# Altium integrated library ATK-DLMP135_baseboard_packaging_libraryV1.0.IntLib: 70 symbols
Pins are listed as number, name and electrical type; pins without a type are passive.

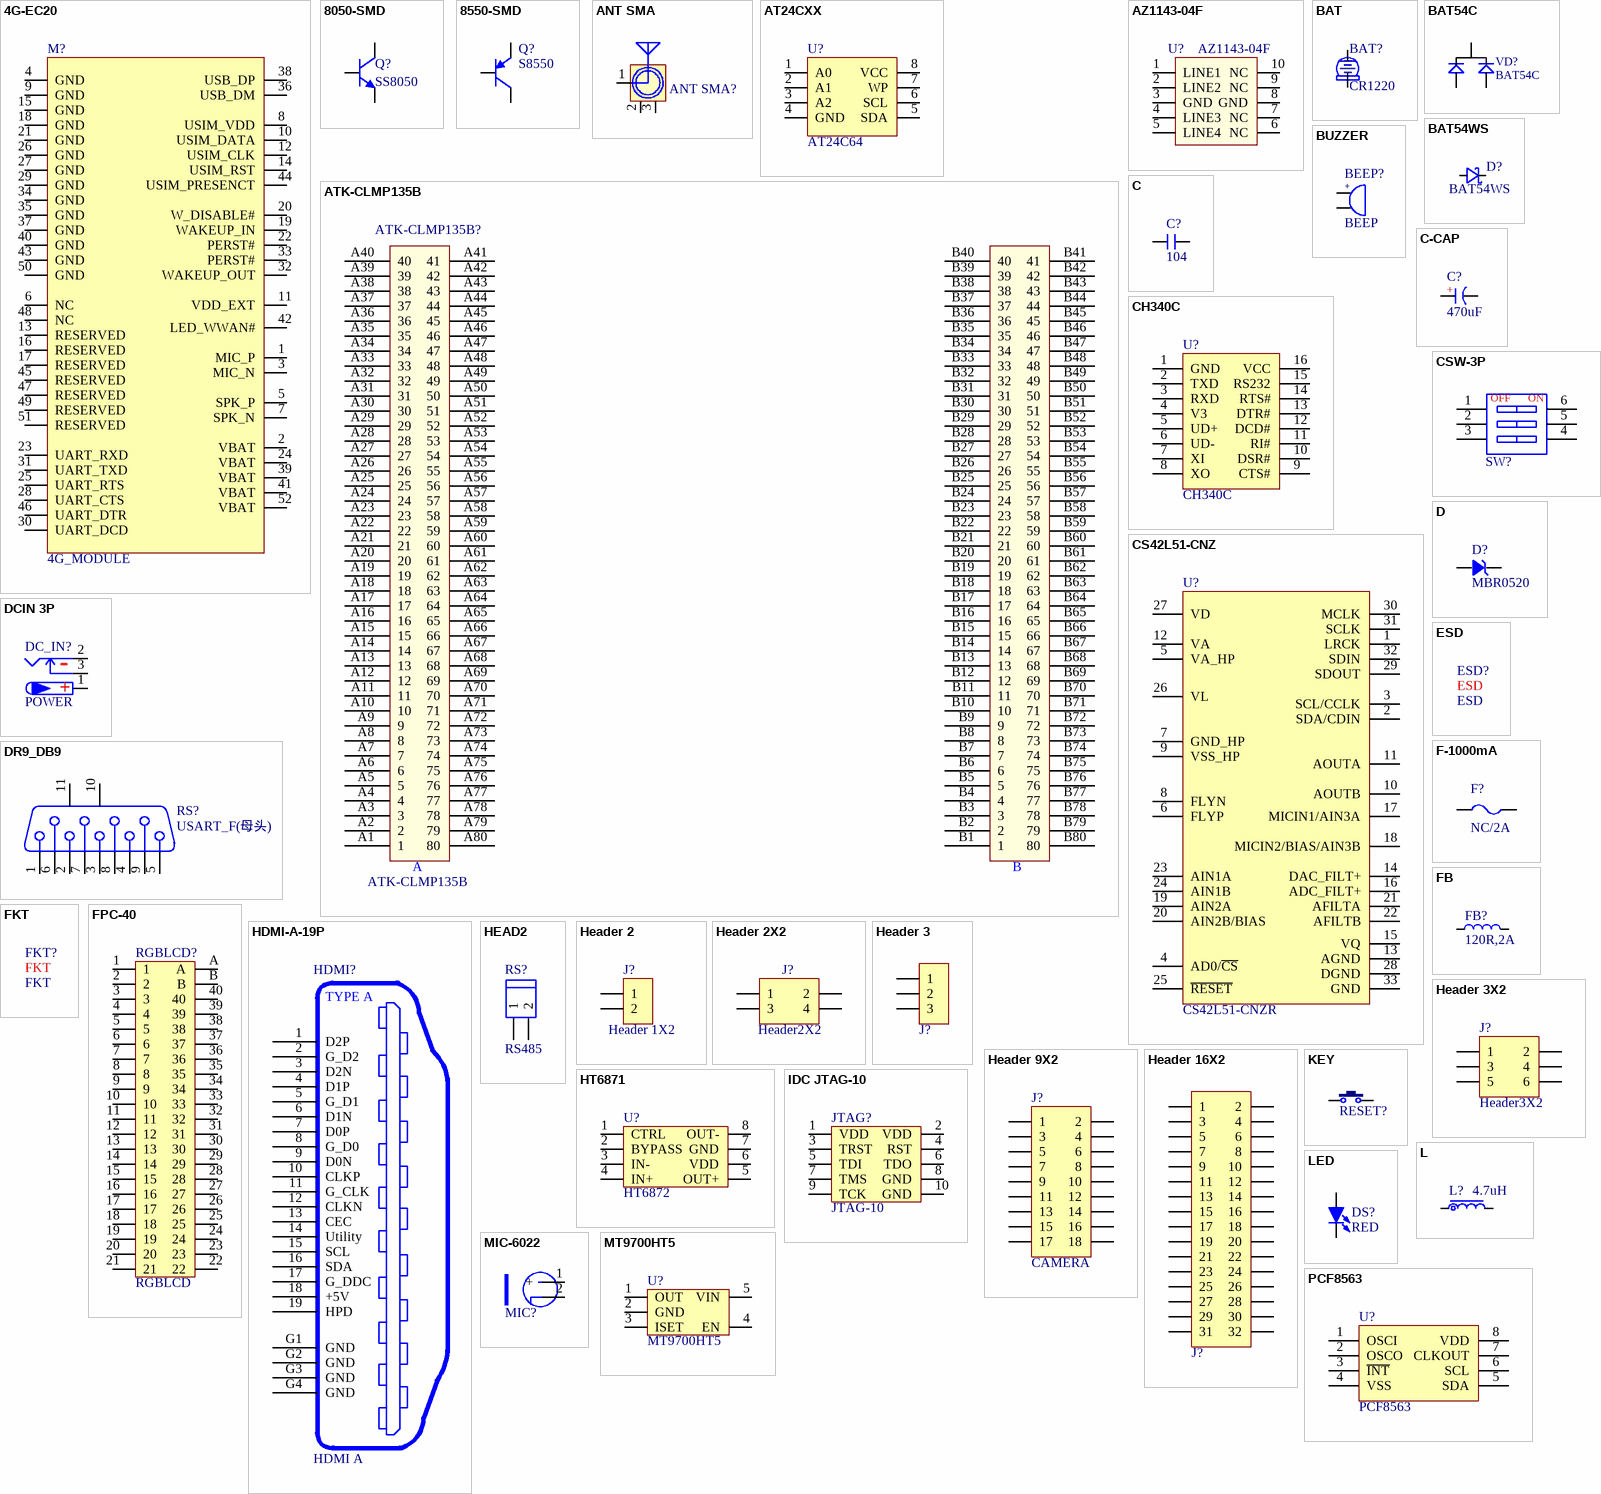
[diagram p0: symbols 4G-EC20 to PCF8563]

## 4G-EC20
designator M?, comment 4G_MODULE
Mini PCIE座子52P; 版权归属: 正点原子; Parameter: 接口器件; 学习资源: www.openedv.com
footprint Mini PCIE 52P
pins: 1 MIC_P, 2 VBAT, 3 MIC_N, 4 GND, 5 SPK_P, 6 NC, 7 SPK_N, 8 USIM_VDD, 9 GND, 10 USIM_DATA, 11 VDD_EXT, 12 USIM_CLK, 13 RESERVED, 14 USIM_RST, 15 GND, 16 RESERVED, 17 RESERVED, 18 GND, 19 WAKEUP_IN, 20 W_DISABLE#, 21 GND, 22 PERST#, 23 UART_RXD, 24 VBAT, 25 UART_RTS, 26 GND, 27 GND, 28 UART_CTS, 29 GND, 30 UART_DCD, 31 UART_TXD, 32 WAKEUP_OUT, 33 PERST#, 34 GND, 35 GND, 36 USB_DM, 37 GND, 38 USB_DP, 39 VBAT, 40 GND, 41 VBAT, 42 LED_WWAN#, 43 GND, 44 USIM_PRESENCT, 45 RESERVED, 46 UART_DTR, 47 RESERVED, 48 NC, 49 RESERVED, 50 GND, 51 RESERVED, 52 VBAT

## 8050-SMD
designator Q?, comment SS8050
高频放大-NPN型; 版权归属: 正点原子; 属性: 40V 1.5A 1W 100MHZ; Parameter: 三极管; BOM名称: 高频放大-NPN型; 学习资源: www.openedv.com
footprint SOT23-3N (3x1.3x1mm(长宽高))
footprint SOT23-3L (3x1.3x1mm(长宽高))
pins: 1 B, 2 E, 3 C

## 8550-SMD
designator Q?, comment S8550
高频放大-PNP型; 版权归属: 正点原子; 属性: 40V 1.5A 1W 100MHZ; Parameter: 三极管; BOM名称: 高频放大-PNP型; 学习资源: www.openedv.com
footprint SOT23-3N (3x1.3x1mm(长宽高))
footprint SOT23-3L (3x1.3x1mm(长宽高))
pins: 1 B, 2 E, 3 C

## ANT SMA
designator ANT SMA?  (value not drawn)
SMA-2.4G射频天线接口
footprint SMA_FR (SMA 90度射频天线座)
pins: 1 ANT, 2 GND, 3 GND

## AT24CXX
designator U?, comment AT24C64
外置EEPROM; 版权归属: 正点原子; Parameter: 芯片; BOM名称: 外置EEPROM; 学习资源: www.openedv.com
footprint SOP8_N (5*6*1.8mm（长宽高）)
pins: 1 A0, 2 A1, 3 A2, 4 GND, 5 SDA, 6 SCL, 7 WP, 8 VCC (power)

## ATK-CLMP135B
designator ATK-CLMP135B?
MP135核心板BTB连接座
footprint ATK-CLMP135B_CORE
pins: A1 1, A2 2, A3 3, A4 4, A5 5, A6 6, A7 7, A8 8, A9 9, A10 10, A11 11, A12 12, A13 13, A14 14, A15 15, A16 16, A17 17, A18 18, A19 19, A20 20, A21 21, A22 22, A23 23, A24 24, A25 25, A26 26, A27 27, A28 28, A29 29, A30 30, A31 31, A32 32, A33 33, A34 34, A35 35, A36 36, A37 37, A38 38, A39 39, A40 40, A41 41, A42 42, A43 43, A44 44, A45 45, A46 46, A47 47, A48 48, A49 49, A50 50, A51 51, A52 52, A53 53, A54 54, A55 55, A56 56, A57 57, A58 58, A59 59, A60 60, A61 61, A62 62, A63 63, A64 64, A65 65, A66 66, A67 67, A68 68, A69 69, A70 70, A71 71, A72 72, A73 73, A74 74, A75 75, A76 76, A77 77, A78 78, A79 79, A80 80, B1 1, B2 2, B3 3, B4 4, B5 5, B6 6, B7 7, B8 8, B9 9, B10 10, B11 11, B12 12, B13 13, B14 14, B15 15, B16 16, B17 17, B18 18, B19 19, B20 20, B21 21, B22 22, B23 23, B24 24, B25 25, B26 26, B27 27, B28 28, B29 29, B30 30, B31 31, B32 32, B33 33, B34 34, B35 35, B36 36, B37 37, B38 38, B39 39, B40 40, B41 41, B42 42, B43 43, B44 44, B45 45, B46 46, B47 47, B48 48, B49 49, B50 50, B51 51, B52 52, B53 53, B54 54, B55 55, B56 56, B57 57, B58 58, B59 59, B60 60, B61 61, B62 62, B63 63, B64 64, B65 65, B66 66, B67 67, B68 68, B69 69, B70 70, B71 71, B72 72, B73 73, B74 74, B75 75, B76 76, B77 77, B78 78, B79 79, B80 80
text: A; B

## AZ1143-04F
designator U?
ESD保护二极管阵列
footprint DFN2510P10E
pins: 1 LINE1, 2 LINE2, 3 GND, 4 LINE3, 5 LINE4, 6 NC, 7 NC, 8 GND, 9 NC, 10 NC

## BAT
designator BAT?, comment CR1220
电池座; BOM名称: 微型电池; 版权归属: 正点原子; Parameter: 电池; 学习资源: www.openedv.com
footprint CR1220 (纽扣电池座)
pins: 1 DC+, 2 DC-

## BAT54C
designator VD?
肖特基二极管（双）
footprint SOT23-3L (3x1.3x1mm(长宽高))
pins: 1, 2, 3

## BAT54WS
designator D?
肖特基二极管 30V  1V@100mA; 版权归属: 正点原子; 学习资源: www.openedv.com; Parameter: 肖特基二极管
footprint SOD-323
pins: 1 A, 2 K

## BUZZER
designator BEEP?, comment BEEP
蜂鸣器; 版权归属: 正点原子; BOM名称: 蜂鸣器; 学习资源: www.openedv.com; Parameter: 蜂鸣器
footprint BEEP 5.08X9X5.5 (蜂鸣器 5.08*9*5.5mm(脚距,直径))
pins: 1, 2
text: +

## C
designator C?, comment 104
无极性电容; BOM名称: 无极性贴片电容; 版权归属: 正点原子; 学习资源: www.openedv.com
footprint C 0603 (无极性贴片电容)
pins: 1, 2

## C-CAP
designator C?, comment 470uF
有极性电容; 版权归属: 正点原子; 学习资源: www.openedv.com; BOM名称: 有极性电容
footprint CD 6.3*7.7 S (有极性贴片电容直径6.3mm高度7.7mm))
pins: 1 A, 2 K
text: +

## CH340C
designator U?
USB转串口; BOM名称: 串口转USB; 版权归属: 正点原子; Parameter: 芯片; 学习资源: www.openedv.com
footprint SOP16_N (10.3*6.2*1.8mm（长宽高）)
pins: 1 GND, 2 TXD, 3 RXD, 4 V3, 5 UD+, 6 UD-, 7 XI, 8 XO, 9 CTS#, 10 DSR#, 11 RI#, 12 DCD#, 13 DTR#, 14 RTS#, 15 RS232, 16 VCC

## CS42L51-CNZ
designator U?, comment CS42L51-CNZR
音频编解码芯片; 版权归属: 正点原子; Parameter: 芯片; 学习资源: www.openedv.com
footprint QFN32 5x5_N (32脚，长：5mm，宽：5mm，高：9.5mm)
pins: 1 LRCK, 2 SDA/CDIN, 3 SCL/CCLK, 4 AD0/~{CS}, 5 VA_HP (power), 6 FLYP, 7 GND_HP (power), 8 FLYN, 9 VSS_HP (power), 10 AOUTB, 11 AOUTA, 12 VA (power), 13 AGND (power), 14 DAC_FILT+ (power), 15 VQ (power), 16 ADC_FILT+ (power), 17 MICIN1/AIN3A, 18 MICIN2/BIAS/AIN3B, 19 AIN2A, 20 AIN2B/BIAS, 21 AFILTA, 22 AFILTB, 23 AIN1A, 24 AIN1B, 25 ~{RESET}, 26 VL (power), 27 VD (power), 28 DGND (power), 29 SDOUT, 30 MCLK, 31 SCLK, 32 SDIN, 33 GND (power)

## CSW-3P
designator SW?  (value not drawn)
3路编码开关; 版权归属: 正点原子; Parameter: 按键/开关; BOM名称: 3路编码开关; 学习资源: www.openedv.com
footprint CSW 2.54 DIP-3P (拨码开关 2.54mm 3码6脚 直插)
pins: 1, 2, 3, 4, 5, 6
text: OFF; ON

## D
designator D?, comment MBR0520
稳压二极管
footprint SOD-123 (二极管)
footprint SOD-323 (二极管)
footprint SMA
pins: 1, 2

## DCIN 3P
designator DC_IN?, comment POWER
三脚电源座; BOM名称: DC电源接口; 版权归属: 正点原子; Parameter: 接口器件; 学习资源: www.openedv.com
footprint DC10B
pins: 1 (power), 2 (power), 3 (power)
text: -; +

## DR9_DB9
designator RS?, comment USART_F(母头)
9针串口; 版权归属: 正点原子; Parameter: 接口器件; BOM名称: 9针串口; 学习资源: www.openedv.com
footprint DB9(DR9)/S_A(母头) (9针母头串口,31*18.5*12.5mm)
pins: 1, 2, 3, 4, 5, 6, 7, 8, 9, 10 MH1, 11 MH2

## ESD
designator ESD?
防静电; BOM名称: 散热片; 版权归属: 正点原子; Parameter: 未分类器件; 学习资源: www.openedv.com
footprint ESD

## F-1000mA
designator F?, comment NC/2A
自恢复保险丝
footprint FU 1206 (贴片保险丝(1206))
pins: 1, 2

## FB
designator FB?, comment 120R,2A
贴片磁珠; BOM名称: 小功率贴片电感; 版权归属: 正点原子; Parameter: 电感/磁珠; 学习资源: www.openedv.com
footprint L 0603 (小功率贴片电感)
pins: 1, 2

## FKT
designator FKT?
可回收; BOM名称: 散热片; 版权归属: 正点原子; Parameter: 未分类器件; 学习资源: www.openedv.com
footprint FKT

## FPC-40
designator RGBLCD?, comment RGBLCD
FPC-40P-0.5mm
footprint FPC0.5-TOP40P (FPCTOP;0.5mm;)
pins: 1, 2, 3, 4, 5, 6, 7, 8, 9, 10, 11, 12, 13, 14, 15, 16, 17, 18, 19, 20, 21, 22, 23, 24, 25, 26, 27, 28, 29, 30, 31, 32, 33, 34, 35, 36, 37, 38, 39, 40, A, B

## HDMI-A-19P
designator HDMI?, comment HDMI A
HDMI座子; 版权归属: 正点原子; Parameter: 接口器件; 学习资源: www.openedv.com
footprint HDMI-A (A型 直插 HDMI座子)
pins: 1 D2P, 2 G_D2, 3 D2N, 4 D1P, 5 G_D1, 6 D1N, 7 D0P, 8 G_D0, 9 D0N, 10 CLKP, 11 G_CLK, 12 CLKN, 13 CEC, 14 Utility, 15 SCL, 16 SDA, 17 G_DDC, 18 +5V, 19 HPD, G1 GND, G2 GND, G3 GND, G4 GND
text: TYPE A

## HEAD2
designator RS?, comment RS485
footprint KF301-2P
pins: 1, 2

## Header 2
designator J?, comment Header 1X2
2P接插件; 版权归属: 正点原子; Parameter: 接插件; BOM名称: 2P接插件; 学习资源: www.openedv.com
footprint Header 2.54 1X2P (排针(1X2P,2.54,直插))
pins: 1, 2

## Header 2X2
designator J?, comment Header2X2
2*2P接插件; 版权归属: 正点原子; Parameter: 接插件; BOM名称: 2*2P接插件; 学习资源: www.openedv.com
footprint Header 2.54 2X2P (排针(2X2P,2.54,直插))
pins: 1, 2, 3, 4

## Header 3
designator J?, comment Header 1X3  (value not drawn)
3P接插件; 版权归属: 正点原子; Parameter: 接插件; BOM名称: 3P接插件; 学习资源: www.openedv.com
footprint Header 2.54 1X3P (排针(1X3P,2.54,直插))
pins: 1, 2, 3

## Header 3X2
designator J?, comment Header3X2
3*2P接插件; 版权归属: 正点原子; Parameter: 接插件; BOM名称: 3*2P接插件; 学习资源: www.openedv.com
footprint Header 2.54 2X3P (排针(2X3P,2.54,直插))
pins: 1, 2, 3, 4, 5, 6

## Header 9X2
designator J?, comment CAMERA
9*2P接插件; 版权归属: 正点原子; Parameter: 接插件; BOM名称: 9*2P接插件; 学习资源: www.openedv.com
footprint Socket 2.54 2X9P
pins: 1, 2, 3, 4, 5, 6, 7, 8, 9, 10, 11, 12, 13, 14, 15, 16, 17, 18

## Header 16X2
designator J?, comment Header 2X16  (value not drawn)
16*2P接插件; 版权归属: 正点原子; Parameter: 接插件; BOM名称: 16*2P接插件; 学习资源: www.openedv.com
footprint Header 2.54 2X16P (排针(2X16P,2.54,直插))
pins: 1, 2, 3, 4, 5, 6, 7, 8, 9, 10, 11, 12, 13, 14, 15, 16, 17, 18, 19, 20, 21, 22, 23, 24, 25, 26, 27, 28, 29, 30, 31, 32

## HT6871
designator U?, comment HT6872
小喇叭功放芯片; 版权归属: 正点原子; Parameter: 芯片; 学习资源: www.openedv.com
footprint SOP8_N (5*6*1.8mm（长宽高）)
pins: 1 CTRL, 2 BYPASS, 3 IN-, 4 IN+, 5 OUT+, 6 VDD, 7 GND, 8 OUT-

## IDC JTAG-10
designator JTAG?, comment JTAG-10
10Pin JTAG 2.0间距; 版权归属: 正点原子; Parameter: 接口器件; 学习资源: www.openedv.com
footprint JTAG-10 2.0 (JTAG-10 2.0间距)
pins: 1 VDD, 2 VDD, 3 TRST, 4 RST, 5 TDI, 6 TDO, 7 TMS, 8 GND, 9 TCK, 10 GND

## KEY
designator RESET?  (value not drawn)
按键; BOM名称: 3x6轻触开关; 版权归属: 源创客; 学习资源: www.ooocke.com
footprint TSW DIP-6*6*8-2 (6*6*8mm)
pins: 1, 2

## L
designator L?, comment 4.7uH
电感; BOM名称: 功率屏蔽电感; 版权归属: 正点原子; Parameter: 电感/磁珠; 学习资源: www.openedv.com
footprint L-0420 (贴片电感-0420)
footprint L-2520 (贴片电感-2520)
pins: 1, 2

## LED
designator DS?, comment RED
LED; BOM名称: 插件LED; 版权归属: 正点原子; Parameter: 发光二极管; 学习资源: www.openedv.com
footprint LED 0805 Green (绿色0805LED)
footprint LED 0805 Red (红色0805LED)
footprint LED 0805 Yellow (黄色0805LED)
footprint LED 0805 Blue (蓝色0805LED)
pins: 1 A, 2 K

## MIC-6022
designator MIC?  (value not drawn)
MIC; 版权归属: 正点原子; Parameter: 接口器件; 学习资源: www.openedv.com
footprint MIC-6022 (咪头)
pins: 1 +, 2 GND

## MT9700HT5
designator U?
功率开关(5.5V-2A); BOM名称: 稳压芯片; 版权归属: 正点原子; Parameter: 芯片; 学习资源: www.openedv.com
footprint SOT23-5N (3x1.6x1.1mm(长宽高))
pins: 1 OUT, 2 GND, 3 ISET, 4 EN, 5 VIN

## PCF8563
designator U?
footprint SOP8_N (5*6*1.8mm（长宽高）)
pins: 1 OSCI, 2 OSCO, 3 ~{INT}, 4 VSS, 5 SDA, 6 SCL, 7 CLKOUT, 8 VDD

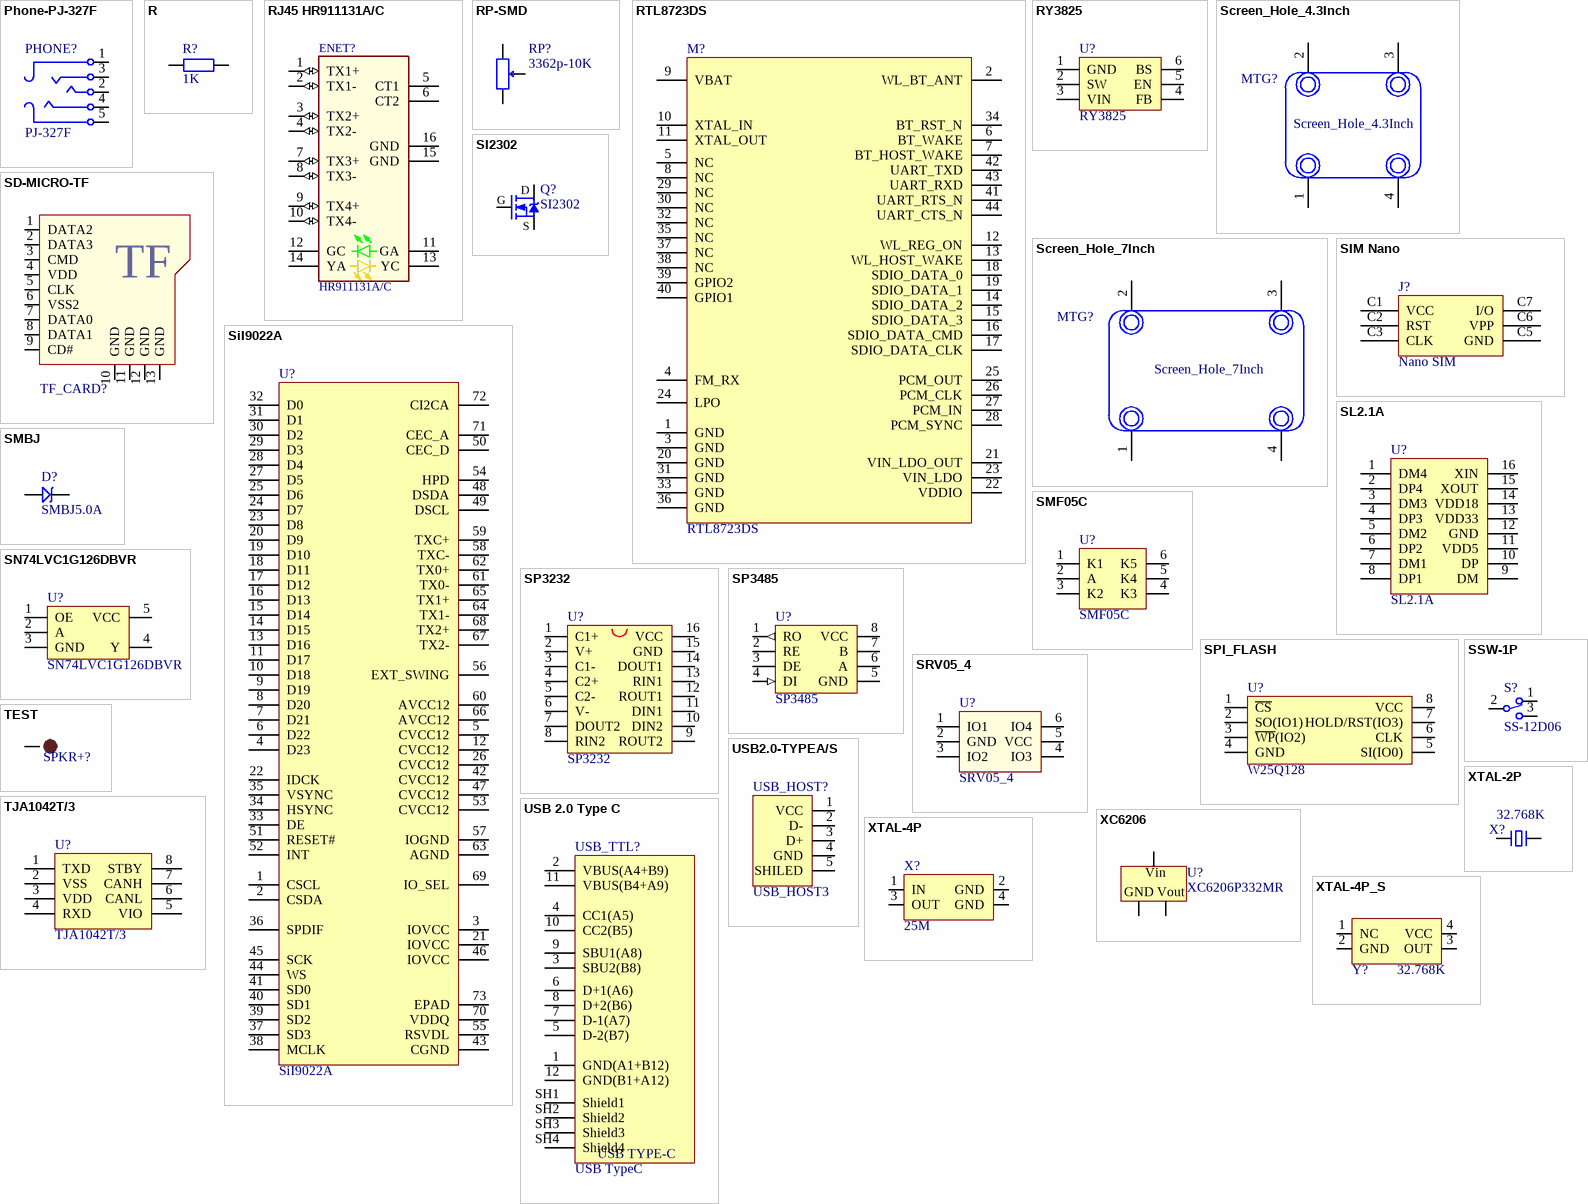
[diagram p1: symbols Phone-PJ-327F to XTAL-4P_S]

## Phone-PJ-327F
designator PHONE?, comment PJ-327F
3.5mm耳机座，带麦; 版权归属: 正点原子; Parameter: 接口器件; 学习资源: www.openedv.com
footprint PJ327F (3.5音频接口，带麦)
pins: 1, 2, 3, 4, 5

## R
designator R?, comment 1K
电阻; BOM名称: 贴片电阻; 版权归属: 正点原子; 学习资源: www.openedv.com; Parameter: 电阻
footprint R 0603 (1/10W贴片电阻)
pins: 1, 2

## RJ45 HR911131A/C
designator ENET?, comment HR911131A/C
千兆以太网接口; 版权归属: 正点原子; Parameter: 接口器件; 学习资源: www.openedv.com
footprint HR911131A (千兆网络RJ45座子)
pins: 1 TX1+ (io), 2 TX1- (io), 3 TX2+ (io), 4 TX2- (io), 5 CT1, 6 CT2, 7 TX3+ (io), 8 TX3- (io), 9 TX4+ (io), 10 TX4- (io), 11 GA, 12 GC, 13 YC, 14 YA, 15 GND (power), 16 GND (power)

## RP-SMD
designator RP?, comment 3362p-10K
电位器; BOM名称: 贴片电位器; 版权归属: 正点原子; Parameter: 电阻; 学习资源: www.openedv.com
footprint 3362P (电位器 100K)
pins: 1, 2, 3

## RTL8723DS
designator M?
SDIO WIFI&BT
footprint WIFI&BT-Module-44P (WIFI&BT模块)
pins: 1 GND, 2 WL_BT_ANT, 3 GND, 4 FM_RX, 5 NC, 6 BT_WAKE, 7 BT_HOST_WAKE, 8 NC, 9 VBAT, 10 XTAL_IN, 11 XTAL_OUT, 12 WL_REG_ON, 13 WL_HOST_WAKE, 14 SDIO_DATA_2, 15  SDIO_DATA_3, 16  SDIO_DATA_CMD, 17 SDIO_DATA_CLK, 18 SDIO_DATA_0, 19 SDIO_DATA_1, 20 GND, 21 VIN_LDO_OUT, 22 VDDIO, 23 VIN_LDO, 24 LPO, 25 PCM_OUT, 26 PCM_CLK, 27 PCM_IN, 28 PCM_SYNC, 29 NC, 30 NC, 31 GND, 32 NC, 33 GND, 34  BT_RST_N, 35 NC, 36 GND, 37 NC, 38 NC, 39 GPIO2, 40 GPIO1, 41 UART_RTS_N, 42 UART_TXD, 43 UART_RXD, 44 UART_CTS_N

## RY3825
designator U?
DC同步降压 4-18V 2A 600KHz Vr=0.768V; 版权归属: 正点原子; Parameter: 芯片; 学习资源: www.openedv.com
footprint SOT23-6N
pins: 1 GND, 2 SW, 3 VIN, 4 FB, 5 EN, 6 BS

## Screen_Hole_4.3Inch
designator MTG?
4.3寸显示屏螺丝孔
footprint 4.3inch_RGBLCD_Hole (4.3寸显示屏螺丝孔)
pins: 1, 2, 3, 4

## Screen_Hole_7Inch
designator MTG?
7寸显示屏螺丝孔
footprint 7Inch_RGBLCD_HOLE (7寸显示屏螺丝孔)
pins: 1, 2, 3, 4

## SD-MICRO-TF
designator TF_CARD?  (value not drawn)
SD,MICRO,TF
footprint SD-MICRO-TF (TF卡座)
pins: 1 DATA2, 2 DATA3, 3 CMD, 4 VDD, 5 CLK, 6 VSS2, 7 DATA0, 8 DATA1, 9 CD#, 10 GND, 11 GND, 12 GND, 13 GND
text: TF

## SI2302
designator Q?
NMOS 20V-+3.0A 55mΩ; BOM名称: N沟道场效应管; 版权归属: 正点原子; Parameter: MOS管; 学习资源: www.openedv.com
footprint SOT23-3N (3x1.3x1mm(长宽高))
pins: 1 G, 2 S, 3 D

## SiI9022A
designator U?
RGB转HDMI芯片; 版权归属: 正点原子; Parameter: 芯片; 学习资源: www.openedv.com
footprint QFN72 10X10 (QFN72P 长10mm，宽10mm)
pins: 1 CSCL, 2 CSDA, 3 IOVCC, 4 D23, 5 CVCC12, 6 D22, 7 D21, 8 D20, 9 D19, 10 D18, 11 D17, 12 CVCC12, 13 D16, 14 D15, 15 D14, 16 D13, 17 D12, 18 D11, 19 D10, 20 D9, 21 IOVCC, 22 IDCK, 23 D8, 24 D7, 25 D6, 26 CVCC12, 27 D5, 28 D4, 29 D3, 30 D2, 31 D1, 32 D0, 33 DE, 34 HSYNC, 35 VSYNC, 36 SPDIF, 37 SD3, 38 MCLK, 39 SD2, 40 SD1, 41 SD0, 42 CVCC12, 43 CGND, 44 WS, 45 SCK, 46 IOVCC, 47 CVCC12, 48 DSDA, 49 DSCL, 50 CEC_D, 51 RESET#, 52 INT, 53 CVCC12, 54 HPD, 55 RSVDL, 56 EXT_SWING, 57 IOGND, 58 TXC-, 59 TXC+, 60 AVCC12, 61 TX0-, 62 TX0+, 63 AGND, 64 TX1-, 65 TX1+, 66 AVCC12, 67 TX2-, 68 TX2+, 69 IO_SEL, 70 VDDQ, 71 CEC_A, 72 CI2CA, 73 EPAD

## SIM Nano
designator J?, comment Nano SIM
Nano SIM卡座; 版权归属: 正点原子; Parameter: 接口器件; 学习资源: www.openedv.com
footprint Nano SIM 7P (7P弹出式Nano SIM卡座)
pins: C1 VCC, C2 RST, C3 CLK, C4 NC hidden, C5 GND, C6 VPP, C7 I/O

## SL2.1A
designator U?
1拖4 USB HUB; BOM名称: 串口转USB; 版权归属: 正点原子; Parameter: 芯片; 学习资源: www.openedv.com
footprint SOP16_N
pins: 1 DM4, 2 DP4, 3 DM3, 4 DP3, 5 DM2, 6 DP2, 7 DM1, 8 DP1, 9 DM, 10 DP, 11 VDD5, 12 GND, 13 VDD33, 14 VDD18, 15 XOUT, 16 XIN

## SMBJ
designator D?, comment SMBJ5.0A
TVS
footprint SMBJ
pins: 1, 2

## SMF05C
designator U?
5线TVS管; 版权归属: 正点原子; Parameter: 芯片; 学习资源: www.openedv.com
footprint SOT363-6L (2.0x2.1x1.1mm(长宽高))
pins: 1 K1, 2 A, 3 K2, 4 K3, 5 K4, 6 K5

## SN74LVC1G126DBVR
designator U?
1路 非反向三态缓冲器 高有效; 版权归属: 正点原子; Parameter: 芯片; 学习资源: www.openedv.com
footprint SOT23-5N
pins: 1 OE, 2 A, 3 GND, 4 Y, 5 VCC

## SP3232
designator U?
RS232通讯芯片; 版权归属: 正点原子; Parameter: 芯片; BOM名称: RS232通讯芯片; 学习资源: www.openedv.com
footprint SOP16_N (10.3*6.2*1.8mm（长宽高）)
pins: 1 C1+, 2 V+, 3 C1-, 4 C2+, 5 C2-, 6 V-, 7 DOUT2, 8 RIN2, 9 ROUT2, 10 DIN2, 11 DIN1, 12 ROUT1, 13 RIN1, 14 DOUT1, 15 GND, 16 VCC

## SP3485
designator U?
RS485总线收发芯片; 版权归属: 正点原子; Parameter: 芯片; BOM名称: RS485总线收发芯片; 学习资源: www.openedv.com
footprint SOP8_N
pins: 1 RO (out), 2 RE, 3 DE, 4 DI (in), 5 GND, 6 A, 7 B, 8 VCC

## SPI_FLASH
designator U?, comment W25Q128
footprint SOP8W_N (5.3*8.3*1.8mm（长宽高）)
pins: 1 ~{CS}, 2 SO(IO1), 3 ~{WP}(IO2), 4 GND, 5 SI(IO0) (power), 6 CLK, 7 HOLD/RST(IO3) (power), 8 VCC

## SRV05_4
designator U?
ESD保护二极管阵列
footprint SOT23-6N (3x1.6x1.1mm(长宽高))
pins: 1 IO1, 2 GND, 3 IO2, 4 IO3, 5 VCC, 6 IO4

## SSW-1P
designator S?, comment SS-12D06
1路波动开关; BOM名称: 波动开关; 版权归属: 正点原子; Parameter: 按键/开关; 学习资源: www.openedv.com
footprint SS-12D06 (脚距3mm)
pins: 1, 2, 3

## TEST
designator SPKR+?, comment SPKR+  (value not drawn)
测试点; 版权归属: 正点原子; Parameter: 未分类器件; BOM名称: 测试点; 学习资源: www.openedv.com
footprint TEST 1 (测试点1mm)
footprint TEST 1.6 (测试点1.6mm)
footprint TEST 1.4 (测试点1.4mm)
footprint TEST 1.8 (测试点1.8mm)
footprint TEST 1.2 (测试点1.2mm)
footprint TEST0.8 (测试点1mm)
pins: 1

## TJA1042T/3
designator U?
footprint SOP8_N (5*6*1.8mm（长宽高）)
pins: 1 TXD, 2 VSS, 3 VDD, 4 RXD, 5 VIO, 6 CANL, 7 CANH, 8 STBY

## USB2.0-TYPEA/S
designator USB_HOST?, comment USB_HOST3
USB-A型母接口; 版权归属: 正点原子; Parameter: 接口器件; BOM名称: USB-A型母接口; 学习资源: www.openedv.com
footprint USB 2.0_TEPE A AF90 (USB 2.0_TEPE A 型母头，侧插)
pins: 1 VCC, 2 D-, 3 D+, 4 GND, 5 SHILED

## USB 2.0 Type C
designator USB_TTL?, comment USB TypeC
12P TypeC 母座; 版权归属: 正点原子; Parameter: 接口器件; 学习资源: www.openedv.com
footprint USB2.0-TYPE-C-16P (USB Type-C 12P/16P 加固定焊盘)
pins: 1 GND(A1+B12), 2 VBUS(A4+B9), 3 SBU2(B8), 4 CC1(A5), 5 D-2(B7), 6 D+1(A6), 7 D-1(A7), 8 D+2(B6), 9 SBU1(A8), 10 CC2(B5), 11 VBUS(B4+A9), 12 GND(B1+A12), SH1 Shield1, SH2 Shield2, SH3 Shield3, SH4 Shield4
text: USB TYPE-C

## XC6206
designator U?, comment XC6206P332MR
LDO 5.5V 200-300mA; 版权归属: 正点原子; Parameter: 芯片; Package: SOT-23; 学习资源: www.openedv.com
footprint SOT23-3L (3x1.3x1mm(长宽高))
footprint SOT23-3N (3x1.3x1mm(长宽高))
pins: 1 GND, 2 Vout, 3 Vin

## XTAL-2P
designator X?, comment 32.768K
2脚无源晶振; BOM名称: 2脚晶振; 版权归属: 正点原子; Parameter: 晶振; 学习资源: www.openedv.com
footprint XTAL-2X6H
footprint XTAL-49S DIP
pins: 1, 2

## XTAL-4P
designator X?, comment 25M
4脚无源晶振; BOM名称: 4脚晶振; 版权归属: 正点原子; Parameter: 晶振; 学习资源: www.openedv.com
footprint XTAL-3225
pins: 1 IN, 2 GND, 3 OUT, 4 GND

## XTAL-4P_S
designator Y?, comment 32.768K
4脚有源晶振; BOM名称: 4脚晶振; 版权归属: 正点原子; Parameter: 晶振; 学习资源: www.openedv.com
footprint XTAL-3225 - S (3225有源晶振)
pins: 1 NC, 2 GND, 3 OUT, 4 VCC

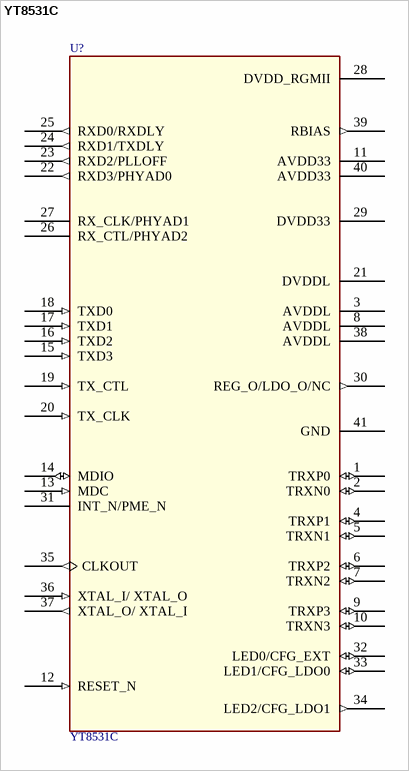
[diagram p2: symbol YT8531C]

## YT8531C
designator U?
千兆以太网PHY; 版权归属: 正点原子; Parameter: 芯片; 学习资源: www.openedv.com
footprint QFN40 5X5_N
pins: 1 TRXP0 (io), 2 TRXN0 (io), 3 AVDDL (power), 4 TRXP1 (io), 5 TRXN1 (io), 6 TRXP2 (io), 7 TRXN2 (io), 8 AVDDL (power), 9 TRXP3 (io), 10 TRXN3 (io), 11 AVDD33 (power), 12 RESET_N (in), 13 MDC (in), 14 MDIO (io), 15 TXD3 (in), 16 TXD2 (in), 17 TXD1 (in), 18 TXD0 (in), 19 TX_CTL (in), 20 TX_CLK (in), 21 DVDDL (power), 22 RXD3/PHYAD0 (out), 23 RXD2/PLLOFF (out), 24 RXD1/TXDLY (out), 25 RXD0/RXDLY (out), 26 RX_CTL/PHYAD2, 27 RX_CLK/PHYAD1, 28 DVDD_RGMII (power), 29 DVDD33 (power), 30 REG_O/LDO_O/NC (out), 31 INT_N/PME_N, 32 LED0/CFG_EXT (io), 33 LED1/CFG_LDO0 (io), 34 LED2/CFG_LDO1 (out), 35 CLKOUT (out), 36 XTAL_I/ XTAL_O (in), 37 XTAL_O/ XTAL_I (out), 38 AVDDL (power), 39 RBIAS (out), 40 AVDD33 (power), 41 GND (power)